# Altium footprint library AD_Lib.PcbLib: 508 footprints (part 30 of 32)
Each footprint in its own frame and in the unit in brackets; x right, y up, seen from the top. Pads: shape width x height; smd on the part's side, far side on the other; paste and mask are expansions set on the pad; w line width, h text height; cw(c..) or ccw(c..) is an arc to the next point about the centre after c.
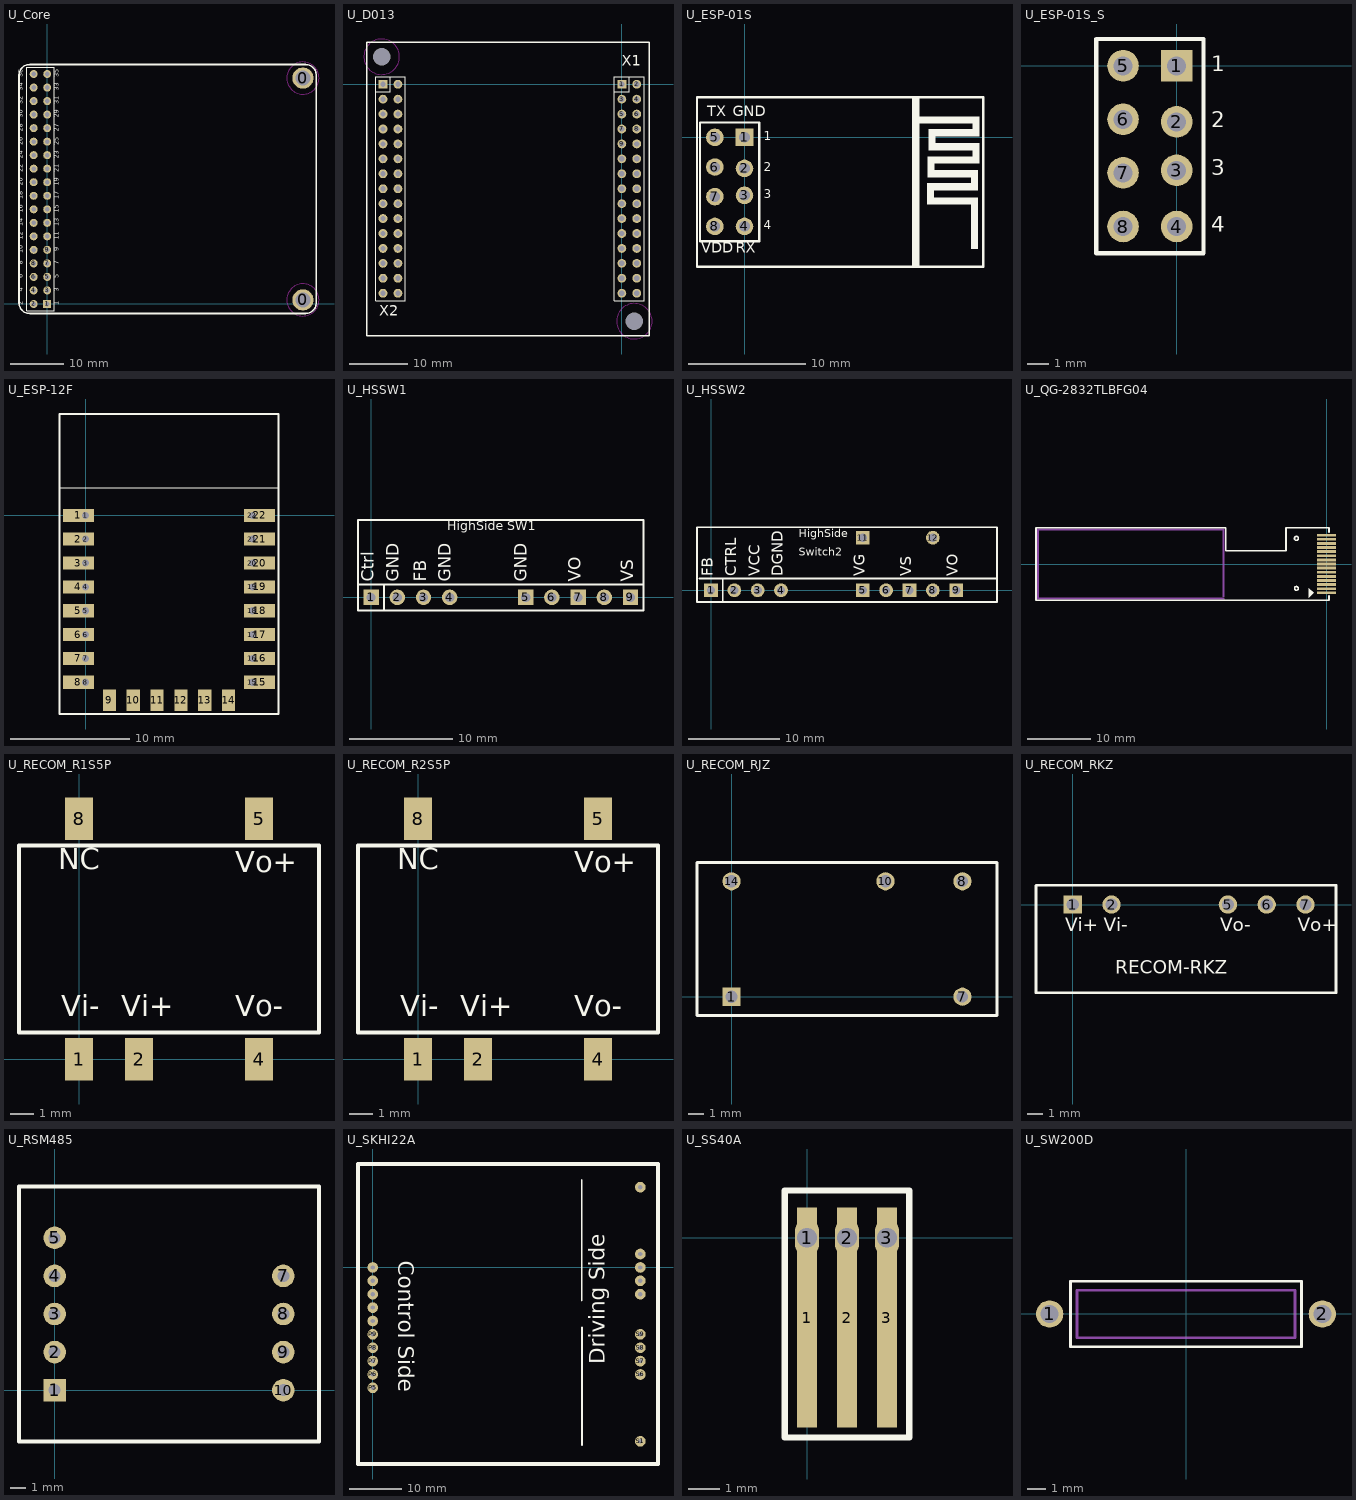
[diagram p29: the footprints below, top view; thin cyan lines are the x and y axes]

## U_Core [mm] "MVB插座，803-PP-NNN-10-001101"
height 1.45
pads (38):
  round 4 hole 2.8: 0(48.006,0.762) 0(48.006,42.418)
  rect 1.5x1.5 hole 0.9: 1(0,0)
  round 1.5 hole 0.9: 2(-2.54,0) 3(0,2.54) 4(-2.54,2.54) 5(0,5.08) 6(-2.54,5.08) 7(0,7.62) 8(-2.54,7.62) 9(0,10.16) 10(-2.54,10.16) 11(0,12.7) 12(-2.54,12.7) 13(0,15.24) 14(-2.54,15.24) 15(0,17.78) 16(-2.54,17.78) 17(0,20.32) 18(-2.54,20.32) 19(0,22.86) 20(-2.54,22.86) 21(0,25.4) 22(-2.54,25.4) 23(0,27.94) 24(-2.54,27.94) 25(0,30.48) 26(-2.54,30.48) 27(0,33.02) 28(-2.54,33.02) 29(0,35.56) 30(-2.54,35.56) 31(0,38.1) 32(-2.54,38.1) 33(0,40.64) 34(-2.54,40.64) 35(0,43.18) 36(-2.54,43.18)
Top Overlay:
  lines w0.2: -3.81,-1.27 -3.81,44.45 1.27,44.45 1.27,-1.27 -3.81,-1.27
  lines w0.3: -5.302,0.222 ccw(c-3.302,0.222) -3.302,-1.778 48.514,-1.778 ccw(c48.514,0.222) 50.514,0.222 50.514,42.958 ccw(c48.514,42.958) 48.514,44.958 -3.302,44.958 ccw(c-3.302,42.958) -5.302,42.958 -5.302,0.222
  text "36" at -4.191,42.545 h1.52
  text "35" at 2.54,42.545 h1.52
  text "33" at 2.54,40.005 h1.52
  text "31" at 2.54,37.465 h1.52
  text "1" at 2.54,-0.254 h1.52
  text "3" at 2.54,2.286 h1.52
  text "5" at 2.54,4.826 h1.52
  text "7" at 2.54,7.366 h1.52
  text "34" at -4.191,40.005 h1.52
  text "8" at -4.191,7.366 h1.52
  text "6" at -4.191,4.826 h1.52
  text "4" at -4.191,2.286 h1.52
  text "2" at -4.191,-0.254 h1.52
  text "10" at -4.191,9.525 h1.52
  text "12" at -4.191,12.065 h1.52
  text "24" at -4.191,27.305 h1.52
  text "22" at -4.191,24.765 h1.52
  text "20" at -4.191,22.225 h1.52
  text "18" at -4.191,19.685 h1.52
  text "16" at -4.191,17.145 h1.52
  text "14" at -4.191,14.605 h1.52
  text "30" at -4.191,34.925 h1.52
  text "28" at -4.191,32.385 h1.52
  text "26" at -4.191,29.845 h1.52
  text "25" at 2.54,29.845 h1.52
  text "27" at 2.54,32.385 h1.52
  text "29" at 2.54,34.925 h1.52
  text "13" at 2.54,14.605 h1.52
  text "15" at 2.54,17.145 h1.52
  text "17" at 2.54,19.685 h1.52
  text "19" at 2.54,22.225 h1.52
  text "21" at 2.54,24.765 h1.52
  text "23" at 2.54,27.305 h1.52
  text "11" at 2.54,12.065 h1.52
  text "9" at 2.54,9.906 h1.52
  text "32" at -4.191,37.465 h1.52
Bottom Overlay:
  text "36" at -4.191,43.688 h1.52
  text "34" at -4.191,41.148 h1.52
  text "23" at 2.54,28.448 h1.52
  text "21" at 2.54,25.908 h1.52
  text "19" at 2.54,23.368 h1.52
  text "27" at 2.54,33.528 h1.52
  text "25" at 2.54,30.988 h1.52
  text "8" at -4.191,7.874 h1.52
  text "6" at -4.191,5.334 h1.52
  text "4" at -4.191,2.794 h1.52
  text "2" at -4.191,0.254 h1.52
  text "10" at -4.191,10.541 h1.52
  text "26" at -4.191,30.988 h1.52
  text "28" at -4.191,33.528 h1.52
  text "30" at -4.191,36.068 h1.52
  text "14" at -4.191,15.748 h1.52
  text "16" at -4.191,18.288 h1.52
  text "18" at -4.191,20.828 h1.52
  text "20" at -4.191,23.368 h1.52
  text "22" at -4.191,25.908 h1.52
  text "24" at -4.191,28.448 h1.52
  text "12" at -4.191,13.208 h1.52
  text "32" at -4.191,38.608 h1.52
Keep-Out Layer:
  circle w0.152: c48.006,0.762 r3.022
  circle w0.152: c48.006,42.418 r3.022

## U_D013 [mm] "MVB插座，803-PP-NNN-10-001101"
height 1.45
pads (62):
  round 1 hole 3: 0(-40.87,4.67)
  round 1 hole 3 paste+0: 0(2.13,-40.33)
  rect 1.5x1.5 hole 0.9: 1(0,0) 31(-40.64,0)
  round 1.5 hole 0.9: 2(2.54,0) 3(0,-2.54) 4(2.54,-2.54) 5(0,-5.08) 6(2.54,-5.08) 7(0,-7.62) 8(2.54,-7.62) 9(0,-10.16) 10(2.54,-10.16) 11(0,-12.7) 12(2.54,-12.7) 13(0,-15.24) 14(2.54,-15.24) 15(0,-17.78) 16(2.54,-17.78) 17(0,-20.32) 18(2.54,-20.32) 19(0,-22.86) 20(2.54,-22.86) 21(0,-25.4) 22(2.54,-25.4) 23(0,-27.94) 24(2.54,-27.94) 25(0,-30.48) 26(2.54,-30.48) 27(0,-33.02) 28(2.54,-33.02) 29(0,-35.56) 30(2.54,-35.56) 32(-38.1,0) 33(-40.64,-2.54) 34(-38.1,-2.54) 35(-40.64,-5.08) 36(-38.1,-5.08) 37(-40.64,-7.62) 38(-38.1,-7.62) 39(-40.64,-10.16) 40(-38.1,-10.16) 41(-40.64,-12.7) 42(-38.1,-12.7) 43(-40.64,-15.24) 44(-38.1,-15.24) 45(-40.64,-17.78) 46(-38.1,-17.78) 47(-40.64,-20.32) 48(-38.1,-20.32) 49(-40.64,-22.86) 50(-38.1,-22.86) 51(-40.64,-25.4) 52(-38.1,-25.4) 53(-40.64,-27.94) 54(-38.1,-27.94) 55(-40.64,-30.48) 56(-38.1,-30.48) 57(-40.64,-33.02) 58(-38.1,-33.02) 59(-40.64,-35.56) 60(-38.1,-35.56)
Top Overlay:
  lines w0.152: -41.91,-1.27 -39.37,-1.27 -39.37,1.27 ; -1.27,-1.27 1.27,-1.27 1.27,1.27
  lines w0.2: -41.91,-36.83 -41.91,1.27 -36.83,1.27 -36.83,-36.83 -41.91,-36.83 ; -1.27,-36.83 -1.27,1.27 3.81,1.27 3.81,-36.83 -1.27,-36.83
  lines w0.254: -43.37,-42.83 -43.37,7.17 4.63,7.17 4.63,-42.83 -43.37,-42.83
  text "X2" at -41.275,-40.005 h3.05
  text "X1" at 0,2.54 h3.05
Keep-Out Layer:
  circle w0.152: c-40.87,4.67 r3.022
  circle w0.152: c2.13,-40.33 r3.022

## U_ESP-01S [mm] "安信可WiFi模块ESP-01 & ESP-01S系列"
height 11.2
pads (8):
  rect 1.5x1.5 hole 0.9: 1(0,0)
  round 1.5 hole 0.9: 2(0,-2.66) 3(0,-4.96) 4(0,-7.62) 5(-2.54,0) 6(-2.54,-2.54) 7(-2.54,-5.08) 8(-2.54,-7.62)
Top Overlay:
  rectangle: 14.436,-11.06 14.859,3.44
  region: 14.859,1.789 14.859,1.205 20.091,1.205 20.091,1.789
  region: 19.507,1.205 19.507,0.087 20.091,0.087 20.091,1.205
  region: 15.748,0.697 15.748,0.087 19.507,0.087 19.507,0.697
  region: 15.748,0.087 15.748,-1.107 16.332,-1.107 16.332,0.087
  region: 16.332,-0.497 16.332,-1.107 20.091,-1.107 20.091,-0.497
  region: 19.507,-1.107 19.507,-2.224 20.091,-2.224 20.091,-1.107
  region: 15.672,-1.64 15.672,-2.224 19.507,-2.224 19.507,-1.64
  region: 15.672,-2.224 15.672,-3.418 16.256,-3.418 16.256,-2.224
  region: 16.256,-2.783 16.256,-3.418 19.99,-3.418 19.99,-2.783
  region: 19.38,-3.418 19.38,-4.536 19.99,-4.536 19.99,-3.418
  region: 15.621,-3.926 15.621,-4.536 19.38,-4.536 19.38,-3.926
  region: 15.621,-4.536 15.621,-5.729 16.231,-5.729 16.231,-4.536
  region: 16.231,-5.145 16.231,-5.729 19.99,-5.729 19.99,-5.145
  region: 19.38,-5.729 19.38,-9.565 19.99,-9.565 19.99,-5.729
  lines w0.2: 14.436,-11.06 14.436,3.44 ; 14.859,-11.06 14.859,3.44 ; -4.064,-11.06 -4.064,3.44 20.436,3.44 20.436,-11.06 -4.064,-11.06 ; -3.81,-8.89 1.27,-8.89 1.27,1.27 -3.81,1.27 -3.81,-8.89
  text "4" at 1.651,-8.128 h1.27
  text "1" at 1.651,-0.508 h1.27
  text "2" at 1.651,-3.175 h1.27
  text "3" at 1.651,-5.461 h1.27
  text "RX" at -0.762,-10.16 h1.52
  text "VDD" at -3.683,-10.16 h1.52
  text "TX" at -3.175,1.524 h1.52
  text "GND" at -1.016,1.524 h1.52
Bottom Overlay:
  text "4" at 2.032,-8.128 h1.27
  text "3" at 2.032,-5.461 h1.27
  text "1" at 2.032,-0.508 h1.27
  text "2" at 2.032,-3.175 h1.27
  text "GND" at 1.27,1.524 h1.52
  text "TX" at -1.778,1.524 h1.52
  text "VDD" at -1.524,-10.16 h1.52
  text "RX" at 0.635,-10.16 h1.52

## U_ESP-01S_S [mm] "安信可WiFi模块ESP-01 & ESP-01S系列 小封装"
height 11.2
pads (8):
  rect 1.5x1.5 hole 0.9: 1(0,0)
  round 1.5 hole 0.9: 2(0,-2.66) 3(0,-4.96) 4(0,-7.62) 5(-2.54,0) 6(-2.54,-2.54) 7(-2.54,-5.08) 8(-2.54,-7.62)
Top Overlay:
  lines w0.2: -3.81,-8.89 -3.81,1.27 1.27,1.27 1.27,-8.89 -3.81,-8.89
  text "3" at 1.651,-5.461 h1.27
  text "2" at 1.651,-3.175 h1.27
  text "1" at 1.651,-0.508 h1.27
  text "4" at 1.651,-8.128 h1.27
Bottom Overlay:
  text "2" at 2.032,-3.175 h1.27
  text "1" at 2.032,-0.508 h1.27
  text "3" at 2.032,-5.461 h1.27
  text "4" at 2.032,-8.128 h1.27

## U_ESP-12F [mm] "安信可ESP8266系列之ESP-12F或ESP-12E"
height 3
pads (38):
  rect 2.6x1.1 smd: 1(-0.6,0) 2(-0.6,-2) 3(-0.6,-4) 4(-0.6,-6) 5(-0.6,-8) 6(-0.6,-10) 7(-0.6,-12) 8(-0.6,-14) 15(14.6,-14) 16(14.6,-12) 17(14.6,-10) 18(14.6,-8) 19(14.6,-6) 20(14.6,-4) 21(14.6,-2) 22(14.6,0)
  rect 0.762x1 hole 0.6: 1(0,0) 7(0,-12)
  rect 0.762x1 / inner rect 0.762x1 / far side rect 1x1 hole 0.6: 2(0,-2) 3(0,-4) 4(0,-6) 5(0,-8) 6(0,-10) 8(0,-14) 15(14,-14) 16(14,-12) 17(14,-10) 18(14,-8) 19(14,-6) 20(14,-4) 21(14,-2) 22(14,0)
  rect 1.1x1.8 smd: 9(2,-15.5) 10(4,-15.5) 11(6,-15.5) 12(8,-15.5) 13(10,-15.5) 14(12,-15.5)
Top Overlay:
  lines w0.1: -2.195,2.3 16.195,2.3
  lines w0.152: -2.195,-16.665 16.195,-16.665 16.195,8.5 -2.195,8.5 -2.195,-16.665

## U_HSSW1 [mm] "自制件，高测"
height 10.16
pads (9):
  rect 1.5x1.5 hole 0.9: 1(0,0) 5(14.986,0) 7(20.066,0) 9(25.146,0)
  round 1.5 hole 0.9: 2(2.54,0) 3(5.08,0) 4(7.62,0) 6(17.526,0) 8(22.606,0)
Top Overlay:
  lines w0.2: -1.27,1.27 26.416,1.27 ; -1.27,7.493 26.416,7.493 26.416,-1.27 -1.27,-1.27 -1.27,7.5 ; 1.27,-1.27 1.27,1.27
  text "GND" at 15.494,1.524 h2.03
  text "GND" at 8.128,1.524 h2.03
  text "FB" at 5.715,1.524 h2.03
  text "GND" at 3.048,1.524 h2.03
  text "HighSide SW1" at 7.366,6.223 h1.52
  text "Ctrl" at 0.635,1.524 h2.03
  text "VO" at 20.701,1.524 h2.03
  text "VS" at 25.781,1.524 h2.03

## U_HSSW2 [mm] "自制件，高侧开关，隔离+反馈"
height 15.494
pads (11):
  rect 1.5x1.5 hole 0.9: 1(0,0) 5(16.51,0) 7(21.59,0) 9(26.67,0) 11(16.51,5.715)
  round 1.5 hole 0.9: 2(2.54,0) 3(5.08,0) 4(7.62,0) 6(19.05,0) 8(24.13,0) 12(24.13,5.715)
Top Overlay:
  lines w0.2: -1.27,1.27 30.988,1.27 ; 1.27,-1.27 1.27,1.27 ; 31.115,6.83 31.115,-1.27 -1.524,-1.27 -1.524,6.858 31.115,6.858
  text "DGND" at 8.255,1.524 h2.03
  text "VCC" at 5.715,1.524 h2.03
  text "CTRL" at 3.175,1.524 h2.03
  text "HighSide" at 9.525,5.461 h1.52
  text "FB" at 0.635,1.524 h2.03
  text "VG" at 17.145,1.524 h2.03
  text "VS" at 22.225,1.524 h2.03
  text "VO" at 27.305,1.524 h2.03
  text "Switch2" at 9.525,3.429 h1.52

## U_QG-2832TLBFG04 [mm] "全智景Allvision之QG-2832TLBFG04"
pads (15):
  rect 3x0.45 smd: 1(0,-4.55) 2(0,-3.9) 3(0,-3.25) 4(0,-2.6) 5(0,-1.95) 6(0,-1.3) 7(0,-0.65) 8(0,0) 9(0,0.65) 10(0,1.3) 11(0,1.95) 12(0,2.6) 13(0,3.25) 14(0,3.9) 15(0,4.55)
Top Overlay:
  circle w0.254: c-4.75,4.05 r0.316
  circle w0.254: c-4.75,-3.85 r0.292
  region: -2.032,-4.572 -2.794,-3.81 -2.794,-5.334
  lines w0.254: 0.4,-5.006 0.4,-5.75 -45.9,-5.75 -45.9,5.75 -15.9,5.75 -15.9,2.1 -10.65,2.1 -6.4,2.1 -6.4,5.75 0.4,5.75 0.4,5.006
Mechanical 15:
  region: -16.15,5.55 -45.7,5.55 -45.7,-5.55 -16.15,-5.55 -16.15,-5.3 -45.5,-5.3 -45.5,5.35 -16.4,5.35 -16.4,-5.2 -16.15,-5.2

## U_RECOM_R1S5P [mm] "DC/DC隔离电源模块；R1S/R1D之5pin 系列；RECOM"
height 7.3
pads (5):
  rect 1.2x1.8 smd: 1(0,0) 2(2.54,0) 4(7.62,0) 5(7.62,10.2) 8(0,10.2)
Top Overlay:
  lines w0.178: -2.54,1.143 10.16,1.143 10.16,9.057 -2.54,9.057 -2.54,1.143
  text "NC" at -0.889,7.747 h1.52
  text "Vo+" at 6.604,7.62 h1.52
  text "Vo-" at 6.604,1.524 h1.52
  text "Vi+" at 1.778,1.524 h1.52
  text "Vi-" at -0.762,1.524 h1.52

## U_RECOM_R2S5P [mm] "RECOM之R2S系列DC/DC，5Pin"
height 9
pads (5):
  rect 1.2x1.8 smd: 1(0,0) 2(2.54,0) 4(7.62,0) 5(7.62,10.2) 8(0,10.2)
Top Overlay:
  lines w0.178: -2.54,1.143 10.16,1.143 10.16,9.057 -2.54,9.057 -2.54,1.143
  text "NC" at -0.889,7.747 h1.52
  text "Vo+" at 6.604,7.62 h1.52
  text "Vo-" at 6.604,1.524 h1.52
  text "Vi+" at 1.778,1.524 h1.52
  text "Vi-" at -0.762,1.524 h1.52

## U_RECOM_RJZ [mm] "RECOM之DC/DC模块"
height 7.27
pads (5):
  rect 1.2x1.2 hole 0.8: 1(0,0)
  round 1.2 hole 0.762: 7(15.24,0) 8(15.24,7.62)
  round 1.2 hole 0.8: 10(10.16,7.62) 14(0,7.62)
Top Overlay:
  lines w0.2: -2.28,-1.24 17.52,-1.24 17.52,8.86 -2.28,8.86 -2.28,3.175 -2.28,-1.24

## U_RECOM_RKZ [mm] "RECOM之RKZ系列DC/DC"
height 10
pads (5):
  rect 1.2x1.2 hole 0.8: 1(0,0)
  round 1.2 hole 0.8: 2(2.54,0) 5(10.16,0) 6(12.7,0) 7(15.24,0)
Top Overlay:
  lines w0.178: -2.41,-5.78 17.24,-5.78 17.24,1.27 -2.39,1.27 -2.41,1.25 -2.41,-5.78
  text "RECOM-RKZ" at 2.794,-4.826 h1.52
  text "Vo+" at 14.732,-2.032 h1.52
  text "Vo-" at 9.652,-2.032 h1.52
  text "Vi-" at 2.032,-2.032 h1.52
  text "Vi+" at -0.508,-2.032 h1.52
Bottom Overlay:
  text "Vo-" at 11.43,-2.032 h1.52
  text "Vo+" at 16.764,-2.032 h1.52
  text "Vi+" at 1.143,-2.032 h1.52
  text "Vi-" at 3.556,-2.032 h1.52

## U_RSM485 [mm] "ZLG之隔离RS485收发器，RSM(3)485E(PC)HT"
height 7.1
pads (9):
  rect 1.5x1.5 hole 0.8: 1(0,0)
  round 1.5 hole 0.8: 2(0,2.54) 3(0,5.08) 4(0,7.62) 5(0,10.16) 7(15.24,7.62) 8(15.24,5.08) 9(15.24,2.54) 10(15.24,0)
Top Overlay:
  lines w0.254: -2.38,-3.42 -2.38,13.58 17.62,13.58 17.62,-3.42 -2.38,-3.42
Bottom Overlay:
  text "G" at 13.97,-0.635 h1.78
  text "A" at 13.97,1.905 h1.78
  text "B" at 13.97,4.445 h1.78
  text "DIR" at 3.81,9.525 h1.78
  text "RXD" at 3.81,6.985 h1.78
  text "TXD" at 3.81,4.445 h1.78
  text "GND" at 3.81,1.905 h1.78
  text "VCC" at 3.81,-0.635 h1.78
  text "Vo" at 13.97,6.985 h1.78

## U_SKHI22A [mil] "赛米控IGBT驱动模块"
height 590.55
pads (20):
  round 80 hole 32: P5(0,-900) P6(0,-800) P7(0,-700) P8(0,-600) P9(0,-500) P10(0,-400) P11(0,-300) P12(0,-200) P13(0,-100) P14(0,0) S1(2000,-1300) S6(2000,-800) S7(2000,-700) S8(2000,-600) S9(2000,-500) S12(2000,-200) S13(2000,-100) S14(2000,0) S15(2000,100) s20(2000,600)
Top Overlay:
  lines w12: 1563,-250 1563,656 ; 1564,-1327 1564,-446
  lines w30: -110,-1469 2132,-1469 2132,773 -110,773 -110,-1469
  text "Driving Side" at 1775,-725 h200
  text "Control Side" at 150,50 h200

## U_SS40A [mm] "直脚;TO, Flat Index; 3 In-Line, Axial Leads; Body Dia. 4.7mm; Leads 0.56 x 0.51 mm (max)"
height 4.96
pads (6):
  rect 0.635x7 smd: 1(0,-2.54) 2(1.27,-2.54) 3(2.54,-2.54)
  oval 0.762x1.2 hole 0.635: 1(0,0) 2(1.27,0) 3(2.54,0)
Top Overlay:
  lines w0.2: -0.71,-6.35 -0.71,1.5 3.25,1.5 3.25,-6.35 -0.71,-6.35

## U_SW200D [mm] "SW200D系列震动传感器"
height 3.4
pads (2):
  round 1.5 hole 1: 1(-7.5,0) 2(7.5,0)
Top Overlay:
  lines w0.152: -6.35,-1.8 6.35,-1.8 6.35,1.8 -6.35,1.8 -6.35,-1.8
Mechanical 1:
  lines w0.152: -6,-1.3 -6,1.3 6,1.3 6,-1.3 -6,-1.3